# Altium footprint library ref-packages-longpad.PCBLIB: 1527 footprints (part 80 of 103) (continued)
## SQFP-S-32X32-240 [mil]
pads (240):
  rect 11.81x62.99 smd: 1(-580.71,-653.54) 2(-561.02,-653.54) 3(-541.34,-653.54) 4(-521.65,-653.54) 5(-501.97,-653.54) 6(-482.28,-653.54) 7(-462.6,-653.54) 8(-442.91,-653.54) 9(-423.23,-653.54) 10(-403.54,-653.54) 11(-383.86,-653.54) 12(-364.17,-653.54) 13(-344.49,-653.54) 14(-324.8,-653.54) 15(-305.12,-653.54) 16(-285.43,-653.54) 17(-265.75,-653.54) 18(-246.06,-653.54) 19(-226.38,-653.54) 20(-206.69,-653.54) 21(-187.01,-653.54) 22(-167.32,-653.54) 23(-147.64,-653.54) 24(-127.95,-653.54) 25(-108.27,-653.54) 26(-88.58,-653.54) 27(-68.9,-653.54) 28(-49.21,-653.54) 29(-29.53,-653.54) 30(-9.84,-653.54) 31(9.84,-653.54) 32(29.53,-653.54) 33(49.21,-653.54) 34(68.9,-653.54) 35(88.58,-653.54) 36(108.27,-653.54) 37(127.95,-653.54) 38(147.64,-653.54) 39(167.32,-653.54) 40(187.01,-653.54) 41(206.69,-653.54) 42(226.38,-653.54) 43(246.06,-653.54) 44(265.75,-653.54) 45(285.43,-653.54) 46(305.12,-653.54) 47(324.8,-653.54) 48(344.49,-653.54) 49(364.17,-653.54) 50(383.86,-653.54) 51(403.54,-653.54) 52(423.23,-653.54) 53(442.91,-653.54) 54(462.6,-653.54) 55(482.28,-653.54) 56(501.97,-653.54) 57(521.65,-653.54) 58(541.34,-653.54) 59(561.02,-653.54) 60(580.71,-653.54) 121(580.71,653.54) 122(561.02,653.54) 123(541.34,653.54) 124(521.65,653.54) 125(501.97,653.54) 126(482.28,653.54) 127(462.6,653.54) 128(442.91,653.54) 129(423.23,653.54) 130(403.54,653.54) 131(383.86,653.54) 132(364.17,653.54) 133(344.49,653.54) 134(324.8,653.54) 135(305.12,653.54) 136(285.43,653.54) 137(265.75,653.54) 138(246.06,653.54) 139(226.38,653.54) 140(206.69,653.54) 141(187.01,653.54) 142(167.32,653.54) 143(147.64,653.54) 144(127.95,653.54) 145(108.27,653.54) 146(88.58,653.54) 147(68.9,653.54) 148(49.21,653.54) 149(29.53,653.54) 150(9.84,653.54) 151(-9.84,653.54) 152(-29.53,653.54) 153(-49.21,653.54) 154(-68.9,653.54) 155(-88.58,653.54) 156(-108.27,653.54) 157(-127.95,653.54) 158(-147.64,653.54) 159(-167.32,653.54) 160(-187.01,653.54) 161(-206.69,653.54) 162(-226.38,653.54) 163(-246.06,653.54) 164(-265.75,653.54) 165(-285.43,653.54) 166(-305.12,653.54) 167(-324.8,653.54) 168(-344.49,653.54) 169(-364.17,653.54) 170(-383.86,653.54) 171(-403.54,653.54) 172(-423.23,653.54) 173(-442.91,653.54) 174(-462.6,653.54) 175(-482.28,653.54) 176(-501.97,653.54) 177(-521.65,653.54) 178(-541.34,653.54) 179(-561.02,653.54) 180(-580.71,653.54)
  rect 62.99x11.81 smd: 61(653.54,-580.71) 62(653.54,-561.02) 63(653.54,-541.34) 64(653.54,-521.65) 65(653.54,-501.97) 66(653.54,-482.28) 67(653.54,-462.6) 68(653.54,-442.91) 69(653.54,-423.23) 70(653.54,-403.54) 71(653.54,-383.86) 72(653.54,-364.17) 73(653.54,-344.49) 74(653.54,-324.8) 75(653.54,-305.12) 76(653.54,-285.43) 77(653.54,-265.75) 78(653.54,-246.06) 79(653.54,-226.38) 80(653.54,-206.69) 81(653.54,-187.01) 82(653.54,-167.32) 83(653.54,-147.64) 84(653.54,-127.95) 85(653.54,-108.27) 86(653.54,-88.58) 87(653.54,-68.9) 88(653.54,-49.21) 89(653.54,-29.53) 90(653.54,-9.84) 91(653.54,9.84) 92(653.54,29.53) 93(653.54,49.21) 94(653.54,68.9) 95(653.54,88.58) 96(653.54,108.27) 97(653.54,127.95) 98(653.54,147.64) 99(653.54,167.32) 100(653.54,187.01) 101(653.54,206.69) 102(653.54,226.38) 103(653.54,246.06) 104(653.54,265.75) 105(653.54,285.43) 106(653.54,305.12) 107(653.54,324.8) 108(653.54,344.49) 109(653.54,364.17) 110(653.54,383.86) 111(653.54,403.54) 112(653.54,423.23) 113(653.54,442.91) 114(653.54,462.6) 115(653.54,482.28) 116(653.54,501.97) 117(653.54,521.65) 118(653.54,541.34) 119(653.54,561.02) 120(653.54,580.71) 181(-653.54,580.71) 182(-653.54,561.02) 183(-653.54,541.34) 184(-653.54,521.65) 185(-653.54,501.97) 186(-653.54,482.28) 187(-653.54,462.6) 188(-653.54,442.91) 189(-653.54,423.23) 190(-653.54,403.54) 191(-653.54,383.86) 192(-653.54,364.17) 193(-653.54,344.49) 194(-653.54,324.8) 195(-653.54,305.12) 196(-653.54,285.43) 197(-653.54,265.75) 198(-653.54,246.06) 199(-653.54,226.38) 200(-653.54,206.69) 201(-653.54,187.01) 202(-653.54,167.32) 203(-653.54,147.64) 204(-653.54,127.95) 205(-653.54,108.27) 206(-653.54,88.58) 207(-653.54,68.9) 208(-653.54,49.21) 209(-653.54,29.53) 210(-653.54,9.84) 211(-653.54,-9.84) 212(-653.54,-29.53) 213(-653.54,-49.21) 214(-653.54,-68.9) 215(-653.54,-88.58) 216(-653.54,-108.27) 217(-653.54,-127.95) 218(-653.54,-147.64) 219(-653.54,-167.32) 220(-653.54,-187.01) 221(-653.54,-206.69) 222(-653.54,-226.38) 223(-653.54,-246.06) 224(-653.54,-265.75) 225(-653.54,-285.43) 226(-653.54,-305.12) 227(-653.54,-324.8) 228(-653.54,-344.49) 229(-653.54,-364.17) 230(-653.54,-383.86) 231(-653.54,-403.54) 232(-653.54,-423.23) 233(-653.54,-442.91) 234(-653.54,-462.6) 235(-653.54,-482.28) 236(-653.54,-501.97) 237(-653.54,-521.65) 238(-653.54,-541.34) 239(-653.54,-561.02) 240(-653.54,-580.71)
Top Overlay:
  circle w10: c-559.06,-559.06 r29.53
  lines w8: -620.87,-620.47 620.47,-620.47 620.47,620.47 -620.87,620.47 -620.87,-620.47
Mechanical 16:
  drawing of 244 lines, arcs and shapes, not listed
Mechanical 27:
  lines w7.87: -704.72,-704.72 -704.72,704.72 724.41,704.72 724.41,-704.72 -704.72,-704.72

## SQFP-S-32X32-248 [mil]
pads (248):
  rect 11.81x62.99 smd: 1(-600.39,-653.54) 2(-580.71,-653.54) 3(-561.02,-653.54) 4(-541.34,-653.54) 5(-521.65,-653.54) 6(-501.97,-653.54) 7(-482.28,-653.54) 8(-462.6,-653.54) 9(-442.91,-653.54) 10(-423.23,-653.54) 11(-403.54,-653.54) 12(-383.86,-653.54) 13(-364.17,-653.54) 14(-344.49,-653.54) 15(-324.8,-653.54) 16(-305.12,-653.54) 17(-285.43,-653.54) 18(-265.75,-653.54) 19(-246.06,-653.54) 20(-226.38,-653.54) 21(-206.69,-653.54) 22(-187.01,-653.54) 23(-167.32,-653.54) 24(-147.64,-653.54) 25(-127.95,-653.54) 26(-108.27,-653.54) 27(-88.58,-653.54) 28(-68.9,-653.54) 29(-49.21,-653.54) 30(-29.53,-653.54) 31(-9.84,-653.54) 32(9.84,-653.54) 33(29.53,-653.54) 34(49.21,-653.54) 35(68.9,-653.54) 36(88.58,-653.54) 37(108.27,-653.54) 38(127.95,-653.54) 39(147.64,-653.54) 40(167.32,-653.54) 41(187.01,-653.54) 42(206.69,-653.54) 43(226.38,-653.54) 44(246.06,-653.54) 45(265.75,-653.54) 46(285.43,-653.54) 47(305.12,-653.54) 48(324.8,-653.54) 49(344.49,-653.54) 50(364.17,-653.54) 51(383.86,-653.54) 52(403.54,-653.54) 53(423.23,-653.54) 54(442.91,-653.54) 55(462.6,-653.54) 56(482.28,-653.54) 57(501.97,-653.54) 58(521.65,-653.54) 59(541.34,-653.54) 60(561.02,-653.54) 61(580.71,-653.54) 62(600.39,-653.54) 125(600.39,653.54) 126(580.71,653.54) 127(561.02,653.54) 128(541.34,653.54) 129(521.65,653.54) 130(501.97,653.54) 131(482.28,653.54) 132(462.6,653.54) 133(442.91,653.54) 134(423.23,653.54) 135(403.54,653.54) 136(383.86,653.54) 137(364.17,653.54) 138(344.49,653.54) 139(324.8,653.54) 140(305.12,653.54) 141(285.43,653.54) 142(265.75,653.54) 143(246.06,653.54) 144(226.38,653.54) 145(206.69,653.54) 146(187.01,653.54) 147(167.32,653.54) 148(147.64,653.54) 149(127.95,653.54) 150(108.27,653.54) 151(88.58,653.54) 152(68.9,653.54) 153(49.21,653.54) 154(29.53,653.54) 155(9.84,653.54) 156(-9.84,653.54) 157(-29.53,653.54) 158(-49.21,653.54) 159(-68.9,653.54) 160(-88.58,653.54) 161(-108.27,653.54) 162(-127.95,653.54) 163(-147.64,653.54) 164(-167.32,653.54) 165(-187.01,653.54) 166(-206.69,653.54) 167(-226.38,653.54) 168(-246.06,653.54) 169(-265.75,653.54) 170(-285.43,653.54) 171(-305.12,653.54) 172(-324.8,653.54) 173(-344.49,653.54) 174(-364.17,653.54) 175(-383.86,653.54) 176(-403.54,653.54) 177(-423.23,653.54) 178(-442.91,653.54) 179(-462.6,653.54) 180(-482.28,653.54) 181(-501.97,653.54) 182(-521.65,653.54) 183(-541.34,653.54) 184(-561.02,653.54) 185(-580.71,653.54) 186(-600.39,653.54)
  rect 62.99x11.81 smd: 63(653.54,-600.39) 64(653.54,-580.71) 65(653.54,-561.02) 66(653.54,-541.34) 67(653.54,-521.65) 68(653.54,-501.97) 69(653.54,-482.28) 70(653.54,-462.6) 71(653.54,-442.91) 72(653.54,-423.23) 73(653.54,-403.54) 74(653.54,-383.86) 75(653.54,-364.17) 76(653.54,-344.49) 77(653.54,-324.8) 78(653.54,-305.12) 79(653.54,-285.43) 80(653.54,-265.75) 81(653.54,-246.06) 82(653.54,-226.38) 83(653.54,-206.69) 84(653.54,-187.01) 85(653.54,-167.32) 86(653.54,-147.64) 87(653.54,-127.95) 88(653.54,-108.27) 89(653.54,-88.58) 90(653.54,-68.9) 91(653.54,-49.21) 92(653.54,-29.53) 93(653.54,-9.84) 94(653.54,9.84) 95(653.54,29.53) 96(653.54,49.21) 97(653.54,68.9) 98(653.54,88.58) 99(653.54,108.27) 100(653.54,127.95) 101(653.54,147.64) 102(653.54,167.32) 103(653.54,187.01) 104(653.54,206.69) 105(653.54,226.38) 106(653.54,246.06) 107(653.54,265.75) 108(653.54,285.43) 109(653.54,305.12) 110(653.54,324.8) 111(653.54,344.49) 112(653.54,364.17) 113(653.54,383.86) 114(653.54,403.54) 115(653.54,423.23) 116(653.54,442.91) 117(653.54,462.6) 118(653.54,482.28) 119(653.54,501.97) 120(653.54,521.65) 121(653.54,541.34) 122(653.54,561.02) 123(653.54,580.71) 124(653.54,600.39) 187(-653.54,600.39) 188(-653.54,580.71) 189(-653.54,561.02) 190(-653.54,541.34) 191(-653.54,521.65) 192(-653.54,501.97) 193(-653.54,482.28) 194(-653.54,462.6) 195(-653.54,442.91) 196(-653.54,423.23) 197(-653.54,403.54) 198(-653.54,383.86) 199(-653.54,364.17) 200(-653.54,344.49) 201(-653.54,324.8) 202(-653.54,305.12) 203(-653.54,285.43) 204(-653.54,265.75) 205(-653.54,246.06) 206(-653.54,226.38) 207(-653.54,206.69) 208(-653.54,187.01) 209(-653.54,167.32) 210(-653.54,147.64) 211(-653.54,127.95) 212(-653.54,108.27) 213(-653.54,88.58) 214(-653.54,68.9) 215(-653.54,49.21) 216(-653.54,29.53) 217(-653.54,9.84) 218(-653.54,-9.84) 219(-653.54,-29.53) 220(-653.54,-49.21) 221(-653.54,-68.9) 222(-653.54,-88.58) 223(-653.54,-108.27) 224(-653.54,-127.95) 225(-653.54,-147.64) 226(-653.54,-167.32) 227(-653.54,-187.01) 228(-653.54,-206.69) 229(-653.54,-226.38) 230(-653.54,-246.06) 231(-653.54,-265.75) 232(-653.54,-285.43) 233(-653.54,-305.12) 234(-653.54,-324.8) 235(-653.54,-344.49) 236(-653.54,-364.17) 237(-653.54,-383.86) 238(-653.54,-403.54) 239(-653.54,-423.23) 240(-653.54,-442.91) 241(-653.54,-462.6) 242(-653.54,-482.28) 243(-653.54,-501.97) 244(-653.54,-521.65) 245(-653.54,-541.34) 246(-653.54,-561.02) 247(-653.54,-580.71) 248(-653.54,-600.39)
Top Overlay:
  circle w10: c-559.06,-559.06 r29.53
  lines w8: -620.87,-620.47 620.47,-620.47 620.47,620.47 -620.87,620.47 -620.87,-620.47
Mechanical 16:
  drawing of 252 lines, arcs and shapes, not listed
Mechanical 27:
  lines w7.87: -704.72,-704.72 -704.72,704.72 724.41,704.72 724.41,-704.72 -704.72,-704.72

## SQFP-S-32X32-304 [mm]
pads (304):
  rect 0.25x1.6 smd: 1(-15,-16.6) 2(-14.6,-16.6) 3(-14.2,-16.6) 4(-13.8,-16.6) 5(-13.4,-16.6) 6(-13,-16.6) 7(-12.6,-16.6) 8(-12.2,-16.6) 9(-11.8,-16.6) 10(-11.4,-16.6) 11(-11,-16.6) 12(-10.6,-16.6) 13(-10.2,-16.6) 14(-9.8,-16.6) 15(-9.4,-16.6) 16(-9,-16.6) 17(-8.6,-16.6) 18(-8.2,-16.6) 19(-7.8,-16.6) 20(-7.4,-16.6) 21(-7,-16.6) 22(-6.6,-16.6) 23(-6.2,-16.6) 24(-5.8,-16.6) 25(-5.4,-16.6) 26(-5,-16.6) 27(-4.6,-16.6) 28(-4.2,-16.6) 29(-3.8,-16.6) 30(-3.4,-16.6) 31(-3,-16.6) 32(-2.6,-16.6) 33(-2.2,-16.6) 34(-1.8,-16.6) 35(-1.4,-16.6) 36(-1,-16.6) 37(-0.6,-16.6) 38(-0.2,-16.6) 39(0.2,-16.6) 40(0.6,-16.6) 41(1,-16.6) 42(1.4,-16.6) 43(1.8,-16.6) 44(2.2,-16.6) 45(2.6,-16.6) 46(3,-16.6) 47(3.4,-16.6) 48(3.8,-16.6) 49(4.2,-16.6) 50(4.6,-16.6) 51(5,-16.6) 52(5.4,-16.6) 53(5.8,-16.6) 54(6.2,-16.6) 55(6.6,-16.6) 56(7,-16.6) 57(7.4,-16.6) 58(7.8,-16.6) 59(8.2,-16.6) 60(8.6,-16.6) 61(9,-16.6) 62(9.4,-16.6) 63(9.8,-16.6) 64(10.2,-16.6) 65(10.6,-16.6) 66(11,-16.6) 67(11.4,-16.6) 68(11.8,-16.6) 69(12.2,-16.6) 70(12.6,-16.6) 71(13,-16.6) 72(13.4,-16.6) 73(13.8,-16.6) 74(14.2,-16.6) 75(14.6,-16.6) 76(15,-16.6) 153(15,16.6) 154(14.6,16.6) 155(14.2,16.6) 156(13.8,16.6) 157(13.4,16.6) 158(13,16.6) 159(12.6,16.6) 160(12.2,16.6) 161(11.8,16.6) 162(11.4,16.6) 163(11,16.6) 164(10.6,16.6) 165(10.2,16.6) 166(9.8,16.6) 167(9.4,16.6) 168(9,16.6) 169(8.6,16.6) 170(8.2,16.6) 171(7.8,16.6) 172(7.4,16.6) 173(7,16.6) 174(6.6,16.6) 175(6.2,16.6) 176(5.8,16.6) 177(5.4,16.6) 178(5,16.6) 179(4.6,16.6) 180(4.2,16.6) 181(3.8,16.6) 182(3.4,16.6) 183(3,16.6) 184(2.6,16.6) 185(2.2,16.6) 186(1.8,16.6) 187(1.4,16.6) 188(1,16.6) 189(0.6,16.6) 190(0.2,16.6) 191(-0.2,16.6) 192(-0.6,16.6) 193(-1,16.6) 194(-1.4,16.6) 195(-1.8,16.6) 196(-2.2,16.6) 197(-2.6,16.6) 198(-3,16.6) 199(-3.4,16.6) 200(-3.8,16.6) 201(-4.2,16.6) 202(-4.6,16.6) 203(-5,16.6) 204(-5.4,16.6) 205(-5.8,16.6) 206(-6.2,16.6) 207(-6.6,16.6) 208(-7,16.6) 209(-7.4,16.6) 210(-7.8,16.6) 211(-8.2,16.6) 212(-8.6,16.6) 213(-9,16.6) 214(-9.4,16.6) 215(-9.8,16.6) 216(-10.2,16.6) 217(-10.6,16.6) 218(-11,16.6) 219(-11.4,16.6) 220(-11.8,16.6) 221(-12.2,16.6) 222(-12.6,16.6) 223(-13,16.6) 224(-13.4,16.6) 225(-13.8,16.6) 226(-14.2,16.6) 227(-14.6,16.6) 228(-15,16.6)
  rect 1.6x0.25 smd: 77(16.6,-15) 78(16.6,-14.6) 79(16.6,-14.2) 80(16.6,-13.8) 81(16.6,-13.4) 82(16.6,-13) 83(16.6,-12.6) 84(16.6,-12.2) 85(16.6,-11.8) 86(16.6,-11.4) 87(16.6,-11) 88(16.6,-10.6) 89(16.6,-10.2) 90(16.6,-9.8) 91(16.6,-9.4) 92(16.6,-9) 93(16.6,-8.6) 94(16.6,-8.2) 95(16.6,-7.8) 96(16.6,-7.4) 97(16.6,-7) 98(16.6,-6.6) 99(16.6,-6.2) 100(16.6,-5.8) 101(16.6,-5.4) 102(16.6,-5) 103(16.6,-4.6) 104(16.6,-4.2) 105(16.6,-3.8) 106(16.6,-3.4) 107(16.6,-3) 108(16.6,-2.6) 109(16.6,-2.2) 110(16.6,-1.8) 111(16.6,-1.4) 112(16.6,-1) 113(16.6,-0.6) 114(16.6,-0.2) 115(16.6,0.2) 116(16.6,0.6) 117(16.6,1) 118(16.6,1.4) 119(16.6,1.8) 120(16.6,2.2) 121(16.6,2.6) 122(16.6,3) 123(16.6,3.4) 124(16.6,3.8) 125(16.6,4.2) 126(16.6,4.6) 127(16.6,5) 128(16.6,5.4) 129(16.6,5.8) 130(16.6,6.2) 131(16.6,6.6) 132(16.6,7) 133(16.6,7.4) 134(16.6,7.8) 135(16.6,8.2) 136(16.6,8.6) 137(16.6,9) 138(16.6,9.4) 139(16.6,9.8) 140(16.6,10.2) 141(16.6,10.6) 142(16.6,11) 143(16.6,11.4) 144(16.6,11.8) 145(16.6,12.2) 146(16.6,12.6) 147(16.6,13) 148(16.6,13.4) 149(16.6,13.8) 150(16.6,14.2) 151(16.6,14.6) 152(16.6,15) 229(-16.6,15) 230(-16.6,14.6) 231(-16.6,14.2) 232(-16.6,13.8) 233(-16.6,13.4) 234(-16.6,13) 235(-16.6,12.6) 236(-16.6,12.2) 237(-16.6,11.8) 238(-16.6,11.4) 239(-16.6,11) 240(-16.6,10.6) 241(-16.6,10.2) 242(-16.6,9.8) 243(-16.6,9.4) 244(-16.6,9) 245(-16.6,8.6) 246(-16.6,8.2) 247(-16.6,7.8) 248(-16.6,7.4) 249(-16.6,7) 250(-16.6,6.6) 251(-16.6,6.2) 252(-16.6,5.8) 253(-16.6,5.4) 254(-16.6,5) 255(-16.6,4.6) 256(-16.6,4.2) 257(-16.6,3.8) 258(-16.6,3.4) 259(-16.6,3) 260(-16.6,2.6) 261(-16.6,2.2) 262(-16.6,1.8) 263(-16.6,1.4) 264(-16.6,1) 265(-16.6,0.6) 266(-16.6,0.2) 267(-16.6,-0.2) 268(-16.6,-0.6) 269(-16.6,-1) 270(-16.6,-1.4) 271(-16.6,-1.8) 272(-16.6,-2.2) 273(-16.6,-2.6) 274(-16.6,-3) 275(-16.6,-3.4) 276(-16.6,-3.8) 277(-16.6,-4.2) 278(-16.6,-4.6) 279(-16.6,-5) 280(-16.6,-5.4) 281(-16.6,-5.8) 282(-16.6,-6.2) 283(-16.6,-6.6) 284(-16.6,-7) 285(-16.6,-7.4) 286(-16.6,-7.8) 287(-16.6,-8.2) 288(-16.6,-8.6) 289(-16.6,-9) 290(-16.6,-9.4) 291(-16.6,-9.8) 292(-16.6,-10.2) 293(-16.6,-10.6) 294(-16.6,-11) 295(-16.6,-11.4) 296(-16.6,-11.8) 297(-16.6,-12.2) 298(-16.6,-12.6) 299(-16.6,-13) 300(-16.6,-13.4) 301(-16.6,-13.8) 302(-16.6,-14.2) 303(-16.6,-14.6) 304(-16.6,-15)
Top Overlay:
  circle w0.254: c-14.2,-14.2 r0.75
  lines w0.203: -15.77,-15.76 15.76,-15.76 15.76,15.76 -15.77,15.76 -15.77,-15.76
Mechanical 16:
  drawing of 308 lines, arcs and shapes, not listed
Mechanical 27:
  lines w0.2: -17.9,-17.9 -17.9,17.9 18.4,17.9 18.4,-17.9 -17.9,-17.9

## SQFP-S-32X32-312 [mm]
pads (312):
  rect 0.25x1.6 smd: 1(-15.4,-16.6) 2(-15,-16.6) 3(-14.6,-16.6) 4(-14.2,-16.6) 5(-13.8,-16.6) 6(-13.4,-16.6) 7(-13,-16.6) 8(-12.6,-16.6) 9(-12.2,-16.6) 10(-11.8,-16.6) 11(-11.4,-16.6) 12(-11,-16.6) 13(-10.6,-16.6) 14(-10.2,-16.6) 15(-9.8,-16.6) 16(-9.4,-16.6) 17(-9,-16.6) 18(-8.6,-16.6) 19(-8.2,-16.6) 20(-7.8,-16.6) 21(-7.4,-16.6) 22(-7,-16.6) 23(-6.6,-16.6) 24(-6.2,-16.6) 25(-5.8,-16.6) 26(-5.4,-16.6) 27(-5,-16.6) 28(-4.6,-16.6) 29(-4.2,-16.6) 30(-3.8,-16.6) 31(-3.4,-16.6) 32(-3,-16.6) 33(-2.6,-16.6) 34(-2.2,-16.6) 35(-1.8,-16.6) 36(-1.4,-16.6) 37(-1,-16.6) 38(-0.6,-16.6) 39(-0.2,-16.6) 40(0.2,-16.6) 41(0.6,-16.6) 42(1,-16.6) 43(1.4,-16.6) 44(1.8,-16.6) 45(2.2,-16.6) 46(2.6,-16.6) 47(3,-16.6) 48(3.4,-16.6) 49(3.8,-16.6) 50(4.2,-16.6) 51(4.6,-16.6) 52(5,-16.6) 53(5.4,-16.6) 54(5.8,-16.6) 55(6.2,-16.6) 56(6.6,-16.6) 57(7,-16.6) 58(7.4,-16.6) 59(7.8,-16.6) 60(8.2,-16.6) 61(8.6,-16.6) 62(9,-16.6) 63(9.4,-16.6) 64(9.8,-16.6) 65(10.2,-16.6) 66(10.6,-16.6) 67(11,-16.6) 68(11.4,-16.6) 69(11.8,-16.6) 70(12.2,-16.6) 71(12.6,-16.6) 72(13,-16.6) 73(13.4,-16.6) 74(13.8,-16.6) 75(14.2,-16.6) 76(14.6,-16.6) 77(15,-16.6) 78(15.4,-16.6) 157(15.4,16.6) 158(15,16.6) 159(14.6,16.6) 160(14.2,16.6) 161(13.8,16.6) 162(13.4,16.6) 163(13,16.6) 164(12.6,16.6) 165(12.2,16.6) 166(11.8,16.6) 167(11.4,16.6) 168(11,16.6) 169(10.6,16.6) 170(10.2,16.6) 171(9.8,16.6) 172(9.4,16.6) 173(9,16.6) 174(8.6,16.6) 175(8.2,16.6) 176(7.8,16.6) 177(7.4,16.6) 178(7,16.6) 179(6.6,16.6) 180(6.2,16.6) 181(5.8,16.6) 182(5.4,16.6) 183(5,16.6) 184(4.6,16.6) 185(4.2,16.6) 186(3.8,16.6) 187(3.4,16.6) 188(3,16.6) 189(2.6,16.6) 190(2.2,16.6) 191(1.8,16.6) 192(1.4,16.6) 193(1,16.6) 194(0.6,16.6) 195(0.2,16.6) 196(-0.2,16.6) 197(-0.6,16.6) 198(-1,16.6) 199(-1.4,16.6) 200(-1.8,16.6) 201(-2.2,16.6) 202(-2.6,16.6) 203(-3,16.6) 204(-3.4,16.6) 205(-3.8,16.6) 206(-4.2,16.6) 207(-4.6,16.6) 208(-5,16.6) 209(-5.4,16.6) 210(-5.8,16.6) 211(-6.2,16.6) 212(-6.6,16.6) 213(-7,16.6) 214(-7.4,16.6) 215(-7.8,16.6) 216(-8.2,16.6) 217(-8.6,16.6) 218(-9,16.6) 219(-9.4,16.6) 220(-9.8,16.6) 221(-10.2,16.6) 222(-10.6,16.6) 223(-11,16.6) 224(-11.4,16.6) 225(-11.8,16.6) 226(-12.2,16.6) 227(-12.6,16.6) 228(-13,16.6) 229(-13.4,16.6) 230(-13.8,16.6) 231(-14.2,16.6) 232(-14.6,16.6) 233(-15,16.6) 234(-15.4,16.6)
  rect 1.6x0.25 smd: 79(16.6,-15.4) 80(16.6,-15) 81(16.6,-14.6) 82(16.6,-14.2) 83(16.6,-13.8) 84(16.6,-13.4) 85(16.6,-13) 86(16.6,-12.6) 87(16.6,-12.2) 88(16.6,-11.8) 89(16.6,-11.4) 90(16.6,-11) 91(16.6,-10.6) 92(16.6,-10.2) 93(16.6,-9.8) 94(16.6,-9.4) 95(16.6,-9) 96(16.6,-8.6) 97(16.6,-8.2) 98(16.6,-7.8) 99(16.6,-7.4) 100(16.6,-7) 101(16.6,-6.6) 102(16.6,-6.2) 103(16.6,-5.8) 104(16.6,-5.4) 105(16.6,-5) 106(16.6,-4.6) 107(16.6,-4.2) 108(16.6,-3.8) 109(16.6,-3.4) 110(16.6,-3) 111(16.6,-2.6) 112(16.6,-2.2) 113(16.6,-1.8) 114(16.6,-1.4) 115(16.6,-1) 116(16.6,-0.6) 117(16.6,-0.2) 118(16.6,0.2) 119(16.6,0.6) 120(16.6,1) 121(16.6,1.4) 122(16.6,1.8) 123(16.6,2.2) 124(16.6,2.6) 125(16.6,3) 126(16.6,3.4) 127(16.6,3.8) 128(16.6,4.2) 129(16.6,4.6) 130(16.6,5) 131(16.6,5.4) 132(16.6,5.8) 133(16.6,6.2) 134(16.6,6.6) 135(16.6,7) 136(16.6,7.4) 137(16.6,7.8) 138(16.6,8.2) 139(16.6,8.6) 140(16.6,9) 141(16.6,9.4) 142(16.6,9.8) 143(16.6,10.2) 144(16.6,10.6) 145(16.6,11) 146(16.6,11.4) 147(16.6,11.8) 148(16.6,12.2) 149(16.6,12.6) 150(16.6,13) 151(16.6,13.4) 152(16.6,13.8) 153(16.6,14.2) 154(16.6,14.6) 155(16.6,15) 156(16.6,15.4) 235(-16.6,15.4) 236(-16.6,15) 237(-16.6,14.6) 238(-16.6,14.2) 239(-16.6,13.8) 240(-16.6,13.4) 241(-16.6,13) 242(-16.6,12.6) 243(-16.6,12.2) 244(-16.6,11.8) 245(-16.6,11.4) 246(-16.6,11) 247(-16.6,10.6) 248(-16.6,10.2) 249(-16.6,9.8) 250(-16.6,9.4) 251(-16.6,9) 252(-16.6,8.6) 253(-16.6,8.2) 254(-16.6,7.8) 255(-16.6,7.4) 256(-16.6,7) 257(-16.6,6.6) 258(-16.6,6.2) 259(-16.6,5.8) 260(-16.6,5.4) 261(-16.6,5) 262(-16.6,4.6) 263(-16.6,4.2) 264(-16.6,3.8) 265(-16.6,3.4) 266(-16.6,3) 267(-16.6,2.6) 268(-16.6,2.2) 269(-16.6,1.8) 270(-16.6,1.4) 271(-16.6,1) 272(-16.6,0.6) 273(-16.6,0.2) 274(-16.6,-0.2) 275(-16.6,-0.6) 276(-16.6,-1) 277(-16.6,-1.4) 278(-16.6,-1.8) 279(-16.6,-2.2) 280(-16.6,-2.6) 281(-16.6,-3) 282(-16.6,-3.4) 283(-16.6,-3.8) 284(-16.6,-4.2) 285(-16.6,-4.6) 286(-16.6,-5) 287(-16.6,-5.4) 288(-16.6,-5.8) 289(-16.6,-6.2) 290(-16.6,-6.6) 291(-16.6,-7) 292(-16.6,-7.4) 293(-16.6,-7.8) 294(-16.6,-8.2) 295(-16.6,-8.6) 296(-16.6,-9) 297(-16.6,-9.4) 298(-16.6,-9.8) 299(-16.6,-10.2) 300(-16.6,-10.6) 301(-16.6,-11) 302(-16.6,-11.4) 303(-16.6,-11.8) 304(-16.6,-12.2) 305(-16.6,-12.6) 306(-16.6,-13) 307(-16.6,-13.4) 308(-16.6,-13.8) 309(-16.6,-14.2) 310(-16.6,-14.6) 311(-16.6,-15) 312(-16.6,-15.4)
Top Overlay:
  circle w0.254: c-14.2,-14.2 r0.75
  lines w0.203: -15.77,-15.76 15.76,-15.76 15.76,15.76 -15.77,15.76 -15.77,-15.76
Mechanical 16:
  drawing of 316 lines, arcs and shapes, not listed
Mechanical 27:
  lines w0.2: -17.9,-17.9 -17.9,17.9 18.4,17.9 18.4,-17.9 -17.9,-17.9

## SQFP-S-32X32-400 [mm]
pads (400):
  rect 0.17x1.6 smd: 1(-14.85,-16.6) 2(-14.55,-16.6) 3(-14.25,-16.6) 4(-13.95,-16.6) 5(-13.65,-16.6) 6(-13.35,-16.6) 7(-13.05,-16.6) 8(-12.75,-16.6) 9(-12.45,-16.6) 10(-12.15,-16.6) 11(-11.85,-16.6) 12(-11.55,-16.6) 13(-11.25,-16.6) 14(-10.95,-16.6) 15(-10.65,-16.6) 16(-10.35,-16.6) 17(-10.05,-16.6) 18(-9.75,-16.6) 19(-9.45,-16.6) 20(-9.15,-16.6) 21(-8.85,-16.6) 22(-8.55,-16.6) 23(-8.25,-16.6) 24(-7.95,-16.6) 25(-7.65,-16.6) 26(-7.35,-16.6) 27(-7.05,-16.6) 28(-6.75,-16.6) 29(-6.45,-16.6) 30(-6.15,-16.6) 31(-5.85,-16.6) 32(-5.55,-16.6) 33(-5.25,-16.6) 34(-4.95,-16.6) 35(-4.65,-16.6) 36(-4.35,-16.6) 37(-4.05,-16.6) 38(-3.75,-16.6) 39(-3.45,-16.6) 40(-3.15,-16.6) 41(-2.85,-16.6) 42(-2.55,-16.6) 43(-2.25,-16.6) 44(-1.95,-16.6) 45(-1.65,-16.6) 46(-1.35,-16.6) 47(-1.05,-16.6) 48(-0.75,-16.6) 49(-0.45,-16.6) 50(-0.15,-16.6) 51(0.15,-16.6) 52(0.45,-16.6) 53(0.75,-16.6) 54(1.05,-16.6) 55(1.35,-16.6) 56(1.65,-16.6) 57(1.95,-16.6) 58(2.25,-16.6) 59(2.55,-16.6) 60(2.85,-16.6) 61(3.15,-16.6) 62(3.45,-16.6) 63(3.75,-16.6) 64(4.05,-16.6) 65(4.35,-16.6) 66(4.65,-16.6) 67(4.95,-16.6) 68(5.25,-16.6) 69(5.55,-16.6) 70(5.85,-16.6) 71(6.15,-16.6) 72(6.45,-16.6) 73(6.75,-16.6) 74(7.05,-16.6) 75(7.35,-16.6) 76(7.65,-16.6) 77(7.95,-16.6) 78(8.25,-16.6) 79(8.55,-16.6) 80(8.85,-16.6) 81(9.15,-16.6) 82(9.45,-16.6) 83(9.75,-16.6) 84(10.05,-16.6) 85(10.35,-16.6) 86(10.65,-16.6) 87(10.95,-16.6) 88(11.25,-16.6) 89(11.55,-16.6) 90(11.85,-16.6) 91(12.15,-16.6) 92(12.45,-16.6) 93(12.75,-16.6) 94(13.05,-16.6) 95(13.35,-16.6) 96(13.65,-16.6) 97(13.95,-16.6) 98(14.25,-16.6) 99(14.55,-16.6) 100(14.85,-16.6) 201(14.85,16.6) 202(14.55,16.6) 203(14.25,16.6) 204(13.95,16.6) 205(13.65,16.6) 206(13.35,16.6) 207(13.05,16.6) 208(12.75,16.6) 209(12.45,16.6) 210(12.15,16.6) 211(11.85,16.6) 212(11.55,16.6) 213(11.25,16.6) 214(10.95,16.6) 215(10.65,16.6) 216(10.35,16.6) 217(10.05,16.6) 218(9.75,16.6) 219(9.45,16.6) 220(9.15,16.6) 221(8.85,16.6) 222(8.55,16.6) 223(8.25,16.6) 224(7.95,16.6) 225(7.65,16.6) 226(7.35,16.6) 227(7.05,16.6) 228(6.75,16.6) 229(6.45,16.6) 230(6.15,16.6) 231(5.85,16.6) 232(5.55,16.6) 233(5.25,16.6) 234(4.95,16.6) 235(4.65,16.6) 236(4.35,16.6) 237(4.05,16.6) 238(3.75,16.6) 239(3.45,16.6) 240(3.15,16.6) 241(2.85,16.6) 242(2.55,16.6) 243(2.25,16.6) 244(1.95,16.6) 245(1.65,16.6) 246(1.35,16.6) 247(1.05,16.6) 248(0.75,16.6) 249(0.45,16.6) 250(0.15,16.6) 251(-0.15,16.6) 252(-0.45,16.6) 253(-0.75,16.6) 254(-1.05,16.6) 255(-1.35,16.6) 256(-1.65,16.6) 257(-1.95,16.6) 258(-2.25,16.6) 259(-2.55,16.6) 260(-2.85,16.6) 261(-3.15,16.6) 262(-3.45,16.6) 263(-3.75,16.6) 264(-4.05,16.6) 265(-4.35,16.6) 266(-4.65,16.6) 267(-4.95,16.6) 268(-5.25,16.6) 269(-5.55,16.6) 270(-5.85,16.6) 271(-6.15,16.6) 272(-6.45,16.6) 273(-6.75,16.6) 274(-7.05,16.6) 275(-7.35,16.6) 276(-7.65,16.6) 277(-7.95,16.6) 278(-8.25,16.6) 279(-8.55,16.6) 280(-8.85,16.6) 281(-9.15,16.6) 282(-9.45,16.6) 283(-9.75,16.6) 284(-10.05,16.6) 285(-10.35,16.6) 286(-10.65,16.6) 287(-10.95,16.6) 288(-11.25,16.6) 289(-11.55,16.6) 290(-11.85,16.6) 291(-12.15,16.6) 292(-12.45,16.6) 293(-12.75,16.6) 294(-13.05,16.6) 295(-13.35,16.6) 296(-13.65,16.6) 297(-13.95,16.6) 298(-14.25,16.6) 299(-14.55,16.6) 300(-14.85,16.6)
  rect 1.6x0.17 smd: 101(16.6,-14.85) 102(16.6,-14.55) 103(16.6,-14.25) 104(16.6,-13.95) 105(16.6,-13.65) 106(16.6,-13.35) 107(16.6,-13.05) 108(16.6,-12.75) 109(16.6,-12.45) 110(16.6,-12.15) 111(16.6,-11.85) 112(16.6,-11.55) 113(16.6,-11.25) 114(16.6,-10.95) 115(16.6,-10.65) 116(16.6,-10.35) 117(16.6,-10.05) 118(16.6,-9.75) 119(16.6,-9.45) 120(16.6,-9.15) 121(16.6,-8.85) 122(16.6,-8.55) 123(16.6,-8.25) 124(16.6,-7.95) 125(16.6,-7.65) 126(16.6,-7.35) 127(16.6,-7.05) 128(16.6,-6.75) 129(16.6,-6.45) 130(16.6,-6.15) 131(16.6,-5.85) 132(16.6,-5.55) 133(16.6,-5.25) 134(16.6,-4.95) 135(16.6,-4.65) 136(16.6,-4.35) 137(16.6,-4.05) 138(16.6,-3.75) 139(16.6,-3.45) 140(16.6,-3.15) 141(16.6,-2.85) 142(16.6,-2.55) 143(16.6,-2.25) 144(16.6,-1.95) 145(16.6,-1.65) 146(16.6,-1.35) 147(16.6,-1.05) 148(16.6,-0.75) 149(16.6,-0.45) 150(16.6,-0.15) 151(16.6,0.15) 152(16.6,0.45) 153(16.6,0.75) 154(16.6,1.05) 155(16.6,1.35) 156(16.6,1.65) 157(16.6,1.95) 158(16.6,2.25) 159(16.6,2.55) 160(16.6,2.85) 161(16.6,3.15) 162(16.6,3.45) 163(16.6,3.75) 164(16.6,4.05) 165(16.6,4.35) 166(16.6,4.65) 167(16.6,4.95) 168(16.6,5.25) 169(16.6,5.55) 170(16.6,5.85) 171(16.6,6.15) 172(16.6,6.45) 173(16.6,6.75) 174(16.6,7.05) 175(16.6,7.35) 176(16.6,7.65) 177(16.6,7.95) 178(16.6,8.25) 179(16.6,8.55) 180(16.6,8.85) 181(16.6,9.15) 182(16.6,9.45) 183(16.6,9.75) 184(16.6,10.05) 185(16.6,10.35) 186(16.6,10.65) 187(16.6,10.95) 188(16.6,11.25) 189(16.6,11.55) 190(16.6,11.85) 191(16.6,12.15) 192(16.6,12.45) 193(16.6,12.75) 194(16.6,13.05) 195(16.6,13.35) 196(16.6,13.65) 197(16.6,13.95) 198(16.6,14.25) 199(16.6,14.55) 200(16.6,14.85) 301(-16.6,14.85) 302(-16.6,14.55) 303(-16.6,14.25) 304(-16.6,13.95) 305(-16.6,13.65) 306(-16.6,13.35) 307(-16.6,13.05) 308(-16.6,12.75) 309(-16.6,12.45) 310(-16.6,12.15) 311(-16.6,11.85) 312(-16.6,11.55) 313(-16.6,11.25) 314(-16.6,10.95) 315(-16.6,10.65) 316(-16.6,10.35) 317(-16.6,10.05) 318(-16.6,9.75) 319(-16.6,9.45) 320(-16.6,9.15) 321(-16.6,8.85) 322(-16.6,8.55) 323(-16.6,8.25) 324(-16.6,7.95) 325(-16.6,7.65) 326(-16.6,7.35) 327(-16.6,7.05) 328(-16.6,6.75) 329(-16.6,6.45) 330(-16.6,6.15) 331(-16.6,5.85) 332(-16.6,5.55) 333(-16.6,5.25) 334(-16.6,4.95) 335(-16.6,4.65) 336(-16.6,4.35) 337(-16.6,4.05) 338(-16.6,3.75) 339(-16.6,3.45) 340(-16.6,3.15) 341(-16.6,2.85) 342(-16.6,2.55) 343(-16.6,2.25) 344(-16.6,1.95) 345(-16.6,1.65) 346(-16.6,1.35) 347(-16.6,1.05) 348(-16.6,0.75) 349(-16.6,0.45) 350(-16.6,0.15) 351(-16.6,-0.15) 352(-16.6,-0.45) 353(-16.6,-0.75) 354(-16.6,-1.05) 355(-16.6,-1.35) 356(-16.6,-1.65) 357(-16.6,-1.95) 358(-16.6,-2.25) 359(-16.6,-2.55) 360(-16.6,-2.85) 361(-16.6,-3.15) 362(-16.6,-3.45) 363(-16.6,-3.75) 364(-16.6,-4.05) 365(-16.6,-4.35) 366(-16.6,-4.65) 367(-16.6,-4.95) 368(-16.6,-5.25) 369(-16.6,-5.55) 370(-16.6,-5.85) 371(-16.6,-6.15) 372(-16.6,-6.45) 373(-16.6,-6.75) 374(-16.6,-7.05) 375(-16.6,-7.35) 376(-16.6,-7.65) 377(-16.6,-7.95) 378(-16.6,-8.25) 379(-16.6,-8.55) 380(-16.6,-8.85) 381(-16.6,-9.15) 382(-16.6,-9.45) 383(-16.6,-9.75) 384(-16.6,-10.05) 385(-16.6,-10.35) 386(-16.6,-10.65) 387(-16.6,-10.95) 388(-16.6,-11.25) 389(-16.6,-11.55) 390(-16.6,-11.85) 391(-16.6,-12.15) 392(-16.6,-12.45) 393(-16.6,-12.75) 394(-16.6,-13.05) 395(-16.6,-13.35) 396(-16.6,-13.65) 397(-16.6,-13.95) 398(-16.6,-14.25) 399(-16.6,-14.55) 400(-16.6,-14.85)
Top Overlay:
  circle w0.254: c-14.2,-14.2 r0.75
  lines w0.203: -15.77,-15.76 15.76,-15.76 15.76,15.76 -15.77,15.76 -15.77,-15.76
Mechanical 16:
  drawing of 404 lines, arcs and shapes, not listed
Mechanical 27:
  lines w0.2: -17.9,-17.9 -17.9,17.9 18.4,17.9 18.4,-17.9 -17.9,-17.9